# Altium schematic symbol library IC.SchLib: 555 symbols (part 1 of 15) (continued)
## AD5791BRU (continued)

## AD7610
designator U?
16-Bit, 250 kSPS, Unipolar/Bipolar  Programmable Input PulSAR® ADC; Manufacturer: Analog Devices; Manufacturer No: AD7610BSTZ; Sort: 510; Tech: SMDR; Package: LQFP48; Price: 0
footprint LQFP48 (LQFP, 48-Leads, Body 9,0x9,0mm (max), Pitch 0,50mm, IPC Medium Density)
part A pins: 4 BYTESWAP, 5 OB/~{2C}, 8 SER/~{PAR}, 9 D0, 10 D1, 11 D2/DIVSCLK0, 12 D3/DIVSCLK1, 13 D4/EXT/~{INT}, 14 D5/INVSYNC, 15 D6/INVSCLK, 16 D7/RDC/SDIN, 21 D8/SDOUT, 22 D9/SDCLK, 23 D10/SYNC, 24 D11/RDERR, 25 D12/HW/~{SW}, 26 D13/SCIN, 27 D14/SCCLK, 28 D15/~{SCCS}, 29 BUSY, 30 TEN, 31 ~{RD}, 32 ~{CS}, 33 RESET, 34 PD, 35 ~{CNVST}, 36 BIPOLAR, 37 REF, 38 REFGND, 39 IN-, 43 IN+, 45 TEMP, 46 REFBUFIN, 47 PDREF, 48 PDBUF
part B pins: 1 AGND (power), 2 AVDD (power), 3 AGND (power), 6 OGND (power), 7 OGND (power), 17 OGND (power), 18 OVDD (power), 19 DVDD (power), 20 DGND (power), 40 VCC (power), 41 VEE (power), 42 AGND (power), 44 AVDD (power)

## AD7655ASTZ
designator U?
ADC 16bit, 1MSPS 4ch SAR serial interface; Manufacturer: Analog Devices, Farnell; Manufacturer No: AD7655ASTZ, 9453059; Comment2: 5Vcc, 120mW 3Vcc interface -40..85degC; Sort: 510; Tech: SMDR; Package: LQFP48; Price: 20
footprint LQFP48 (LQFP, 48-Leads, Body 9,0x9,0mm (max), Pitch 0,50mm, IPC Medium Density)
pins: 1 AGND (power), 2 AVDD (power), 3 A0 (in), 4 BYTESWAP (in), 5 A/~{B} (in), 6 DGND (power), 7 IMPULSE (in), 8 SER/~{PAR} (in), 9 D0 (out), 10 D1 (out), 11 DIVSCLK0/D2 (io), 12 DIVSCLK1/D3 (io), 13 EXT/~{INT}/D4 (io), 14 INVSYNC/D5 (io), 15 INVSCLK/D6 (io), 16 RDC/SDIN/D7 (io), 17 OGND (power), 18 OVDD (power), 19 DVDD (power), 20 DGND (power), 21 SDOUT/D8 (io), 22 SCLK/D9 (io), 23 SYNC/D10 (io), 24 RDERROR/D11 (io), 25 D12 (out), 26 D13 (out), 27 D14 (out), 28 D15 (out), 29 BUSY (out), 30 ~{EOC} (out), 31 ~{RD} (in), 32 ~{CS} (in), 33 RESET (in), 34 PD (in), 35 ~{CNVST} (in), 36 DVDD (power), 37 REF (in), 38 REFGND (power), 39 INB1 (in), 40 INBN (in), 41 INB2 (in), 42 REFB (in), 43 REFA (in), 44 INA2 (in), 45 INAN (in), 46 INA1 (in), 47 AGND (power), 48 AGND (power)

## AD7764
designator U?
ADC 24bit, 312kSPS, 109dB Sigma-Delta with On-Chip Buffers and Serial Interface; Manufacturer: Analog Devices; Manufacturer No: AD7764BRUZ; Sort: 510; Tech: SMDR; Package: TSSOP28; Price: 0
footprint TSSOP28 (TSSOP, 28-Leads, Body 9,8x4,5mm (max), Pitch 0,65mm, IPC Medium Density)
pins: 1 VinA- (in), 2 VoutA+ (out), 3 VinA+ (in), 4 VoutA- (out), 5 Vin- (in), 6 Vin+ (in), 7 AVdd2 (power), 8 AGND3 (power), 9 OVERRANGE (out), 10 SCO (out), 11 ~{FSO} (out), 12 SDO (out), 13 SDI (in), 14 ~{FSI} (in), 15 ~{SYNC} (in), 16 ~{RESET}/~{PWRDWN}, 17 DVdd (power), 18 DEC_RATE, 19 MCLK (in), 20 AGND2 (power), 21 AVdd2 (power), 22 Rbias, 23 AGND1 (power), 24 AVdd1 (power), 25 AVdd4 (power), 26 REFGND (power), 27 Vref+ (power), 28 AVdd3 (power)

## AD7765
designator U?
ADC 24bit, 156kSPS, 112dB Sigma-Delta with On-Chip Buffers and Serial Interface; Manufacturer: Analog Devices; Manufacturer No: AD7765BRUZ; Sort: 510; Tech: SMDR; Package: TSSOP28; Price: 0
footprint TSSOP28 (TSSOP, 28-Leads, Body 9,8x4,5mm (max), Pitch 0,65mm, IPC Medium Density)
pins: 1 VinA- (in), 2 VoutA+ (out), 3 VinA+ (in), 4 VoutA- (out), 5 Vin- (in), 6 Vin+ (in), 7 AVdd2 (power), 8 AGND3 (power), 9 OVERRANGE (out), 10 SCO (out), 11 ~{FSO} (out), 12 SDO (out), 13 SDI (in), 14 ~{FSI} (in), 15 ~{SYNC} (in), 16 ~{RESET}/~{PWRDWN}, 17 DVdd (power), 18 DEC_RATE, 19 MCLK (in), 20 AGND2 (power), 21 AVdd2 (power), 22 Rbias, 23 AGND1 (power), 24 AVdd1 (power), 25 AVdd4 (power), 26 REFGND (power), 27 Vref+ (power), 28 AVdd3 (power)

## AD7767BRUZ
designator U?
24bit oversampled SAR ADC 128kSPS; Manufacturer: Analog Devices, Farnell; Manufacturer No: AD7767BRUZ, 1607232; Comment2: 2.5Vcc 1.8..3.6Vcc interface 128kSPS -40..105degC; Sort: 510; Tech: SMDR; Package: TSSOP16; Price: 20,2
signal-integrity model Model Name (Model Description)
footprint TSSOP16 (TSSOP16 5x4.4mm R0.65mm)
pins: 1 AVDD (power), 2 VREF+ (in), 3 REFGND (power), 4 VIN+ (in), 5 VIN- (in), 6 AGND (power), 7 ~{SYNC}/~{PD} (in), 8 DVDD (power), 9 VDRIVE (power), 10 SDO (out), 11 DGND (power), 12 ~{DRDY} (out), 13 SCLK (in), 14 MCLK (in), 15 SDI (in), 16 ~{CS} (in)
1 alternate drawing of the same symbol

## AD7783BRU
designator U?, comment AD7783
24-Bit Sigma Delta ADC with Excitation Current Sources; Manufacturer: Analog Devices; Manufacturer No: AD7783BRU; Comment2: 3 or 5Vcc; Sort: 510; Tech: SMDR; Package: TSSOP16; Price: 0
signal-integrity model Model Name (Model Description)
footprint TSSOP16 (TSSOP16 5x4.4mm R0.65mm)
pins: 1 XTAL1, 2 REFIN+, 3 REFIN-, 4 AIN+ (in), 5 AIN- (in), 6 IOUT1, 7 IOUT2, 8 IPIN (in), 9 RANGE (in), 10 SCLK (io), 11 ~{CS} (in), 12 DOUT/~{RDY} (out), 13 MODE (in), 14 GND (power), 15 VDD (power), 16 XTAL2
1 alternate drawing of the same symbol

## AD7787
designator U?, comment AD7787BRM
ADC 24bit sigma-delta 2ch; Manufacturer: Analog Devices; Comment2: 2.5-5.25V 120SPS; Sort: 510; Tech: SMDR; Manufacturer No: AD7787BRM; Package: MSOP10; Price: 0
footprint MSOP10-1 (MSOP 10pin 3x3mm R0.5mm)
pins: 1 SCLK (in), 2 ~{CS} (in), 3 AIN1+ (in), 4 AIN1- (in), 5 REFIN+ (in), 6 AIN2 (in), 7 GND (power), 8 Vdd (power), 9 DOUT (out), 10 DIN (in)

## AD7791
designator U?, comment AD7791BRM
ADC 24bit sigma-delta 1ch; Manufacturer: Analog Devices; Comment2: 2.5/5.25V 120SPS; Sort: 510; Tech: SMDR; Manufacturer No: AD7791BRM; Package: MSOP10; Price: 0
footprint SOIC8-1
pins: 1 SCLK (in), 2 ~{CS} (in), 3 AIN+ (in), 4 AIN- (in), 5 REFIN+ (in), 6 REFIN- (in), 7 GND (power), 8 Vdd (power), 9 DOUT (out), 10 DIN (in)

## AD7887
designator U?
ADC 12-Bit 2.7V to 5.25V Micropower, 2-Channel, 125 kSPS; Manufacturer: Analog Devices; Manufacturer No: AD7887BRZ; Comment2: 2.7/5.25V 125 kSPS 12Bit; Sort: 510; Tech: SMDR; Package: SOIC8; Price: 0
footprint SOIC8-1
pins: 1 ~{CS}, 2 Vdd, 3 GND, 4 AIN1/Vref, 5 AIN0, 6 DIN, 7 DOUT, 8 SCLK

## AD8021AR
designator U?
Operational amplifier, Precision, Low Noise; Manufacturer: Analog, Farnell; Manufacturer No: AD8021ARZ, 9426000; Comment2: 5..24Vcc, 1mV offset 0.5uVofs/degC; Sort: 520; Tech: SMDR; Package: SOIC8; Price: 5,4
footprint SOIC8-1
pins: 1 LREF, 2 -IN (in), 3 +IN (in), 4 -Vs (power), 5 COMP, 6 OUT (out), 7 +Vs (power), 8 DI~{S}

## AD8021ARM
designator U?
Operational amplifier, Precision, Low Noise Rail-to-Rail; Manufacturer: Analog, Farnell; Manufacturer No: AD8021ARMZ, 1651289; Comment2: 5..24Vcc, 1mV offset 0.5uVofs/degC; Sort: 520; Tech: SMDR; Package: MSOP8; Price: 5,4
footprint MSOP8-1 (TSOP, 8-Leads, Body 3,2x3,2mm (max), Pitch 0,65mm, IPC Medium Density)
pins: 1 LREF, 2 -IN (in), 3 +IN (in), 4 -Vs (power), 5 COMP, 6 OUT (out), 7 +Vs (power), 8 DI~{S}

## AD8099ARD
designator U?
Operational amplifier, Precision, Low Noise Rail-to-Rail; Manufacturer: National Semiconductors, Farnell; Manufacturer No: AD8099ARDZ, 8397848; Comment2: 5..12Vcc, 0.5mVoffset 0.5uVofs/degC 15mAcc; Sort: 520; Tech: SMDR; Package: SOIC8; Price: 3,7
footprint SOIC8-1
pins: 1 FB, 2 -IN (in), 3 +IN (in), 4 -Vs (power), 5 Cc, 6 OUT (out), 7 +Vs (power), 8 DI~{S}

## AD8307AR
designator U?, comment AD8307ARZ
500MHz 92dB Logarithmic Amplifier; Manufacturer: Analog Devices; Sort: 510; Tech: SMDR; Manufacturer No: AD8307ARZ; Package: SOIC8; Price: 0
footprint SOIC8-1
pins: 1 INM (in), 2 COM (power), 3 OFS, 4 OUT (out), 5 INT (in), 6 ENB (in), 7 VPS (power), 8 INP (in)

## AD8318
designator U?
1MHz to 8GHz, 70 dB Logarithmic Detector/Controller; Manufacturer: Analog Devices; Manufacturer No: AD8318ACPZ-WP; Sort: 510; Tech: SMDR; Package: LFCSP16; Price: 0
footprint QFN65P400X400X100-16N2 (QFN, 16-Leads, Body 4,0x4,0mm (max), Pitch 0,65mm, IPC Medium Density)
pins: 1 CMIP, 2 CMIP, 3 VPSI, 4 VPSI, 5 CLPF, 6 VOUT, 7 VSET, 8 CMOP, 9 VPSO, 10 TADJ, 11 CMIP, 12 CMIP, 13 TEMP, 14 INHI, 15 INLO, 16 ENBL, 17 EP (power)

## AD8341
designator U?
1.5 GHz to 2.4 GHz RF Vector Modulator; Manufacturer: Analog Devices; Manufacturer No: AD8341ACPZ-WP; Sort: 510; Tech: SMDR; Package: LFCSP24; Price: 0
footprint LFCSP24
pins: 1 QFLP, 2 QFLM, 3 QBBP, 4 QBBM, 5 VPS2 (power), 6 VPS2 (power), 7 CMOP, 8 CMOP, 9 RFOP, 10 RFOM, 11 CMOP, 12 CMOP, 13 DSOP, 14 VPS2 (power), 15 IBBM, 16 IBBP, 17 IFLM, 18 IFLP, 19 VPRF (power), 20 CMRF, 21 RFIM, 22 RFIP, 23 CMRF, 24 VPRF (power), 25 EPGND (power)

## AD8367A
designator U?
500MHz AGC; Manufacturer: Analog Devices; Manufacturer No: AD8367ARUZ; Sort: 510; Tech: SMDR; Package: TSSOP14; Price: 0
footprint TSSOP14 (TSSOP16 5x4.4mm R0.65mm)
pins: 1 ICOM (power), 2 ENBL (in), 3 INPT (in), 4 MODE (in), 5 GAIN (in), 6 DETO (out), 7 ICOM (power), 8 OCOM (power), 9 DECL (out), 10 VOUT (out), 11 VPSO (power), 12 VPSI (power), 13 HPFL, 14 ICOM (power)

## AD8368
designator U?
500MHz AGC; Manufacturer: Analog Devices; Manufacturer No: AD8367ARUZ; Sort: 510; Tech: SMDR; Package: TSSOP14; Price: 0
footprint LFCSP24
pins: 1 GAIN (in), 2 DETO (out), 3 HPFL, 4 DECL (out), 5 DETI (in), 6 OCOM (power), 7 OCOM (power), 8 OUTP (out), 9 VPSO (power), 10 VPSO (power), 11 VPSI (power), 12 VPSI (power), 13 VPSI (power), 14 DECL (out), 15 DECL (out), 16 ICOM (power), 17 ICOM (power), 18 ICOM (power), 19 INPT (in), 20 ICOM (power), 21 MODE (in), 22 VPSI (power), 23 VPSI (power), 24 ENBL (in), 25 EPAD

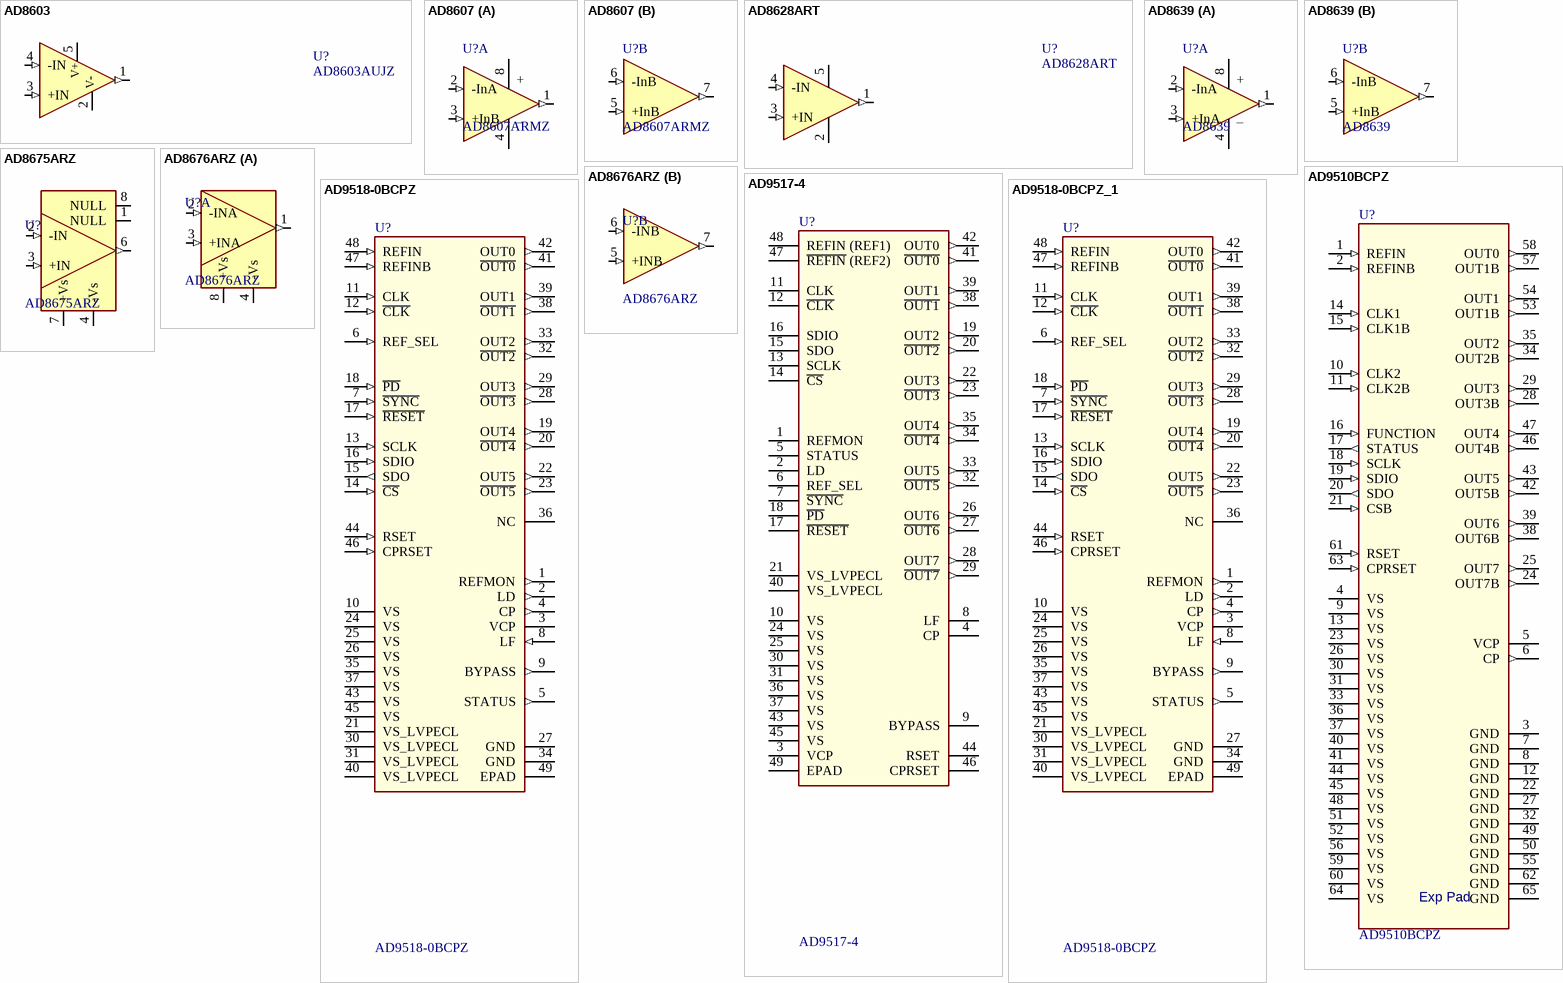
[diagram p3: symbols AD8603 to AD9518-0BCPZ_1]

## AD8603
designator U?, comment AD8603AUJZ
Low noise, Single-Supply, Rail-to-rail IO, Operational Amplifier; Manufacturer: Analog Devices, Farnell; Manufacturer No: AD8603AUJZ, 1651290; Comment2: 1.8-5Vcc, 400KHzBW; Sort: 510; Tech: SMDR; Package: SOT23-5; Price: 0
footprint SOT23-5
pins: 1 OUT (out), 2 V- (power), 3 +IN (in), 4 -IN (in), 5 V+ (power)

## AD8607
designator U?, comment AD8607ARMZ
Operational amplifier, Precision, Low Noise Rail-to-Rail; Manufacturer: National Semiconductors; Comment2: 1.8..5V, 50uV offset; Sort: 510; Tech: SMDR; Manufacturer No: AD8607ARMZ; Package: TSSOP8; Price: 0
footprint TSSOP8 (TSSOP8 3x3mm R0.65mm)
part A pins: 1 OUT (out), 2 -InA (in), 3 +InB (in), 4 V- (power), 8 V+ (power)
part B pins: 5 +InB (in), 6 -InB (in), 7 OUT (out)
part A text: +; _

## AD8628ART
designator U?
Zero-Drift, Single-Supply, Rail-to-rail, Input/Output Operational Amplifier; Manufacturer: Analog Devices; Manufacturer No: AD8628ART-R2; Sort: 510; Tech: SMDR; Package: SOT23; Price: 0
footprint SOT23-5
pins: 1 OUT (out), 2 V- (power), 3 +IN (in), 4 -IN (in), 5 V+ (power)

## AD8639
designator U?
16V Auto-Zero Rail-to-Rail Output Operational Amplifier; Manufacturer: Analog Devices; Manufacturer No: AD8639ARMZ; Comment2: 5V..16V single, +-2.5..+-8V, 9uV offset, 40pA bias input current; Sort: 510; Tech: SMDR; Package: MSOP-8; Price: 0
footprint MSOP8-1 (TSOP, 8-Leads, Body 3,2x3,2mm (max), Pitch 0,65mm, IPC Medium Density)
part A pins: 1 OutA (out), 2 -InA (in), 3 +InA (in), 4 V- (power), 8 V+ (power)
part B pins: 5 +InB (in), 6 -InB (in), 7 OutB (out)
part A text: +; _

## AD8675ARZ
designator U?
Operational amplifier, Precision, Low Noise; Manufacturer: Analog, Farnell; Manufacturer No: AD8675ARZ, 1389164; Comment2: +-5..+-18Vcc, 75uVofs 0.6uV/degC; Sort: 520; Tech: SMDR; Package: SOIC8; Price: 4.1
footprint SOIC8-1
pins: 1 NULL, 2 -IN (in), 3 +IN (in), 4 -Vs (power), 6 OUT (out), 7 +Vs (power), 8 NULL

## AD8676ARZ
designator U?
Dual Operational amplifier, Precision, Low Noise; Manufacturer: Analog, Farnell; Manufacturer No: AD8676ARZ, 1316453; Comment2: +-5..+-18Vcc, 12uVofs 0.6uV/degC; Sort: 520; Tech: SMDR; Package: SOIC8; Price: 4.3
footprint SOIC8-1
part A pins: 1 OUTA (out), 2 -INA (in), 3 +INA (in), 4 -Vs (power), 8 +Vs (power)
part B pins: 5 +INB (in), 6 -INB (in), 7 OUTB (out)

## AD9510BCPZ
designator U?
1.2 GHz Clock Distribution, LFCSP64; Manufacturer: Analog Devices; Sort: 510; Tech: SMDR; Manufacturer No: AD9510BCPZ; Package: LFCSP64; Price: 0
footprint LFCSP64-1
pins: 1 REFIN (in), 2 REFINB (in), 3 GND (power), 4 VS (power), 5 VCP (power), 6 CP (out), 7 GND (power), 8 GND (power), 9 VS (power), 10 CLK2 (in), 11 CLK2B (in), 12 GND (power), 13 VS (power), 14 CLK1 (in), 15 CLK1B (in), 16 FUNCTION (in), 17 STATUS (out), 18 SCLK (in), 19 SDIO (in), 20 SDO (out), 21 CSB (in), 22 GND (power), 23 VS (power), 24 OUT7B (out), 25 OUT7 (out), 26 VS (power), 27 GND (power), 28 OUT3B (out), 29 OUT3 (out), 30 VS (power), 31 VS (power), 32 GND (power), 33 VS (power), 34 OUT2B (out), 35 OUT2 (out), 36 VS (power), 37 VS (power), 38 OUT6B (out), 39 OUT6 (out), 40 VS (power), 41 VS (power), 42 OUT5B (out), 43 OUT5 (out), 44 VS (power), 45 VS (power), 46 OUT4B (out), 47 OUT4 (out), 48 VS (power), 49 GND (power), 50 GND (power), 51 VS (power), 52 VS (power), 53 OUT1B (out), 54 OUT1 (out), 55 GND (power), 56 VS (power), 57 OUT1B (out), 58 OUT0 (out), 59 VS (power), 60 VS (power), 61 RSET (in), 62 GND (power), 63 CPRSET (in), 64 VS (power), 65 GND (power)
text: Exp Pad

## AD9517-4
designator U?
12-Output clock generator with integrated 1.6 GHz VCO; Manufacturer No: AD9517-4BCPZ; Manufacturer: Analog Devices; Sort: 510; Tech: SMDR; Package: LFCSP48; Price: 0
footprint LFCSP48
pins: 1 REFMON, 2 LD, 3 VCP, 4 CP, 5 STATUS, 6 REF_SEL, 7 ~{SYNC}, 8 LF, 9 BYPASS, 10 VS (power), 11 CLK, 12 ~{CLK}, 13 SCLK, 14 ~{CS}, 15 SDO, 16 SDIO, 17 ~{RESET}, 18 ~{PD}, 19 OUT2 (out), 20 ~{OUT2} (out), 21 VS_LVPECL (power), 22 OUT3 (out), 23 ~{OUT3} (out), 24 VS (power), 25 VS (power), 26 OUT6 (out), 27 ~{OUT6} (out), 28 OUT7 (out), 29 ~{OUT7} (out), 30 VS (power), 31 VS (power), 32 ~{OUT5} (out), 33 OUT5 (out), 34 ~{OUT4} (out), 35 OUT4 (out), 36 VS (power), 37 VS (power), 38 ~{OUT1} (out), 39 OUT1 (out), 40 VS_LVPECL (power), 41 ~{OUT0} (out), 42 OUT0 (out), 43 VS (power), 44 RSET, 45 VS (power), 46 CPRSET, 47 ~{REFIN} (REF2), 48 REFIN (REF1), 49 EPAD (power)

## AD9518-0BCPZ
designator U?
6-Output CLK Gen with 2.8 GHz VCO, LFCSP48; Manufacturer: Analog Devices; Sort: 510; Tech: SMDR; Manufacturer No: AD9518-0BCPZ; Package: LFCSP48; Price: 0
footprint LFCSP48
pins: 1 REFMON (out), 2 LD (out), 3 VCP (power), 4 CP (out), 5 STATUS (out), 6 REF_SEL (in), 7 ~{SYNC} (in), 8 LF (in), 9 BYPASS (out), 10 VS (power), 11 CLK (in), 12 ~{CLK} (in), 13 SCLK (in), 14 ~{CS} (in), 15 SDO (out), 16 SDIO (in), 17 ~{RESET} (in), 18 ~{PD} (in), 19 OUT4 (out), 20 ~{OUT4} (out), 21 VS_LVPECL (power), 22 OUT5 (out), 23 ~{OUT5} (out), 24 VS (power), 25 VS (power), 26 VS (power), 27 GND (power), 28 ~{OUT3} (out), 29 OUT3 (out), 30 VS_LVPECL (power), 31 VS_LVPECL (power), 32 ~{OUT2} (out), 33 OUT2 (out), 34 GND (power), 35 VS (power), 36 NC, 37 VS (power), 38 ~{OUT1} (out), 39 OUT1 (out), 40 VS_LVPECL (power), 41 ~{OUT0} (out), 42 OUT0 (out), 43 VS (power), 44 RSET (in), 45 VS (power), 46 CPRSET (in), 47 REFINB (in), 48 REFIN (in), 49 EPAD (power)

## AD9518-0BCPZ_1
designator U?, comment AD9518-0BCPZ
6-Output CLK Gen with 2.8 GHz VCO, LFCSP48; Manufacturer: Analog Devices; Sort: 510; Tech: SMDR; Manufacturer No: AD9518-0BCPZ; Package: LFCSP48; Price: 0
footprint LFCSP48a
pins: 1 REFMON (out), 2 LD (out), 3 VCP (power), 4 CP (out), 5 STATUS (out), 6 REF_SEL (in), 7 ~{SYNC} (in), 8 LF (in), 9 BYPASS (out), 10 VS (power), 11 CLK (in), 12 ~{CLK} (in), 13 SCLK (in), 14 ~{CS} (in), 15 SDO (out), 16 SDIO (in), 17 ~{RESET} (in), 18 ~{PD} (in), 19 OUT4 (out), 20 ~{OUT4} (out), 21 VS_LVPECL (power), 22 OUT5 (out), 23 ~{OUT5} (out), 24 VS (power), 25 VS (power), 26 VS (power), 27 GND (power), 28 ~{OUT3} (out), 29 OUT3 (out), 30 VS_LVPECL (power), 31 VS_LVPECL (power), 32 ~{OUT2} (out), 33 OUT2 (out), 34 GND (power), 35 VS (power), 36 NC, 37 VS (power), 38 ~{OUT1} (out), 39 OUT1 (out), 40 VS_LVPECL (power), 41 ~{OUT0} (out), 42 OUT0 (out), 43 VS (power), 44 RSET (in), 45 VS (power), 46 CPRSET (in), 47 REFINB (in), 48 REFIN (in), 49 EPAD (power)

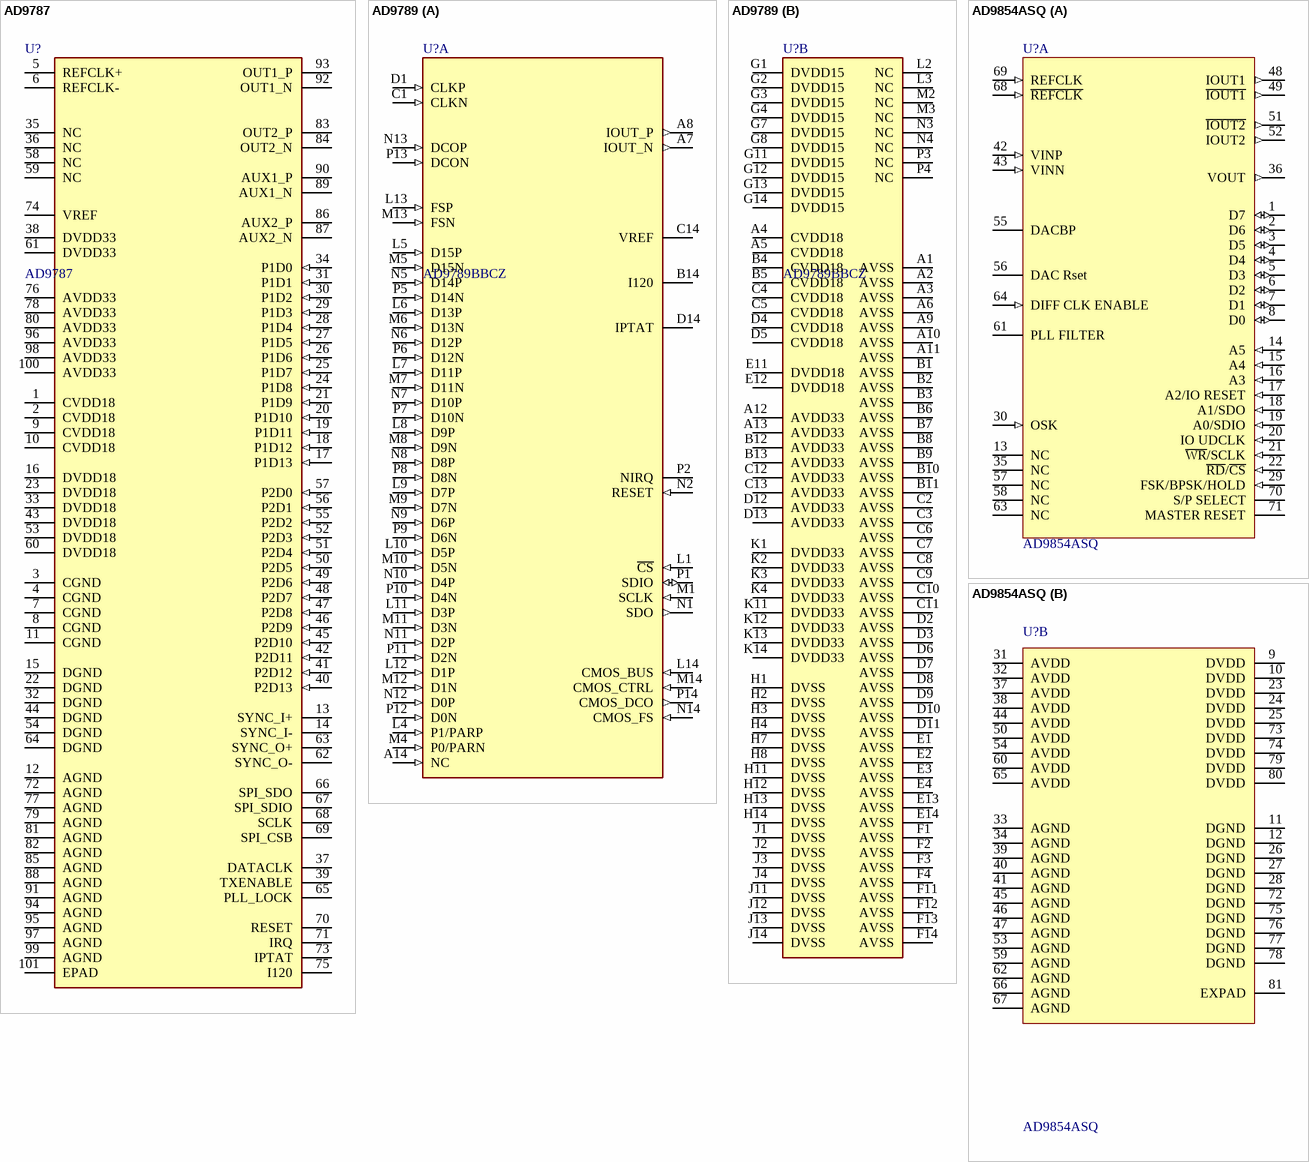
[diagram p4: symbols AD9787 to AD9854ASQ]

## AD9787
designator U?
Dual 14bit 800 MSPS DAC with Low Power 32-bit Complex NCO; Manufacturer No: AD9787BSVZ; Manufacturer: Analog Devices; Tech: SMDR; Sort: 510; Package: TQFP100
footprint TQFP100_EP (Thin QFP 100, 14x14mm, R0.5mm, IPC Medium Density)
pins: 1 CVDD18 (power), 2 CVDD18 (power), 3 CGND, 4 CGND, 5 REFCLK+, 6 REFCLK-, 7 CGND, 8 CGND, 9 CVDD18 (power), 10 CVDD18 (power), 11 CGND, 12 AGND (power), 13 SYNC_I+, 14 SYNC_I-, 15 DGND, 16 DVDD18 (power), 17 P1D13 (in), 18 P1D12 (in), 19 P1D11 (in), 20 P1D10 (in), 21 P1D9 (in), 22 DGND, 23 DVDD18 (power), 24 P1D8 (in), 25 P1D7 (in), 26 P1D6 (in), 27 P1D5 (in), 28 P1D4 (in), 29 P1D3 (in), 30 P1D2 (in), 31 P1D1 (in), 32 DGND, 33 DVDD18 (power), 34 P1D0 (in), 35 NC, 36 NC, 37 DATACLK, 38 DVDD33 (power), 39 TXENABLE, 40 P2D13 (in), 41 P2D12 (in), 42 P2D11 (in), 43 DVDD18 (power), 44 DGND, 45 P2D10 (in), 46 P2D9 (in), 47 P2D8 (in), 48 P2D7 (in), 49 P2D6 (in), 50 P2D5 (in), 51 P2D4 (in), 52 P2D3 (in), 53 DVDD18 (power), 54 DGND, 55 P2D2 (in), 56 P2D1 (in), 57 P2D0 (in), 58 NC, 59 NC, 60 DVDD18 (power), 61 DVDD33 (power), 62 SYNC_O-, 63 SYNC_O+, 64 DGND, 65 PLL_LOCK, 66 SPI_SDO, 67 SPI_SDIO, 68 SCLK, 69 SPI_CSB, 70 RESET, 71 IRQ, 72 AGND (power), 73 IPTAT, 74 VREF, 75 I120, 76 AVDD33 (power), 77 AGND (power), 78 AVDD33 (power), 79 AGND (power), 80 AVDD33 (power), 81 AGND (power), 82 AGND (power), 83 OUT2_P, 84 OUT2_N, 85 AGND (power), 86 AUX2_P, 87 AUX2_N, 88 AGND (power), 89 AUX1_N, 90 AUX1_P, 91 AGND (power), 92 OUT1_N, 93 OUT1_P, 94 AGND (power), 95 AGND (power), 96 AVDD33 (power), 97 AGND (power), 98 AVDD33 (power), 99 AGND (power), 100 AVDD33 (power), 101 EPAD (power)

## AD9789
designator U?, comment AD9789BBCZ
14-Bit, 2400 MSPS RF DAC  with 4-Channel Signal Processing; Manufacturer: Analog Devices; Tech: SMDR; Sort: 510; Manufacturer No: AD9789BBCZ; Package: BGA164
footprint BGA164C80P14X14_1200X1200X130 (BGA, 164-Leads, Body 12,0x12,0mm,  Pitch 0,80mm)
part A pins: A7 IOUT_N (out), A8 IOUT_P (out), A14 NC (in), B14 I120, C1 CLKN (in), C14 VREF, D1 CLKP (in), D14 IPTAT, L1 ~{CS} (in), L4 P1/PARP (in), L5 D15P (in), L6 D13P (in), L7 D11P (in), L8 D9P (in), L9 D7P (in), L10 D5P (in), L11 D3P (in), L12 D1P (in), L13 FSP (in), L14 CMOS_BUS (in), M1 SCLK (in), M4 P0/PARN (in), M5 D15N (in), M6 D13N (in), M7 D11N (in), M8 D9N (in), M9 D7N (in), M10 D5N (in), M11 D3N (in), M12 D1N (in), M13 FSN (in), M14 CMOS_CTRL (in), N1 SDO (out), N2 RESET (in), N5 D14P (in), N6 D12P (in), N7 D10P (in), N8 D8P (in), N9 D6P (in), N10 D4P (in), N11 D2P (in), N12 D0P (in), N13 DCOP (in), N14 CMOS_FS (in), P1 SDIO (io), P2 NIRQ (oc), P5 D14N (in), P6 D12N (in), P7 D10N (in), P8 D8N (in), P9 D6N (in), P10 D4N (in), P11 D2N (in), P12 D0N (in), P13 DCON (in), P14 CMOS_DCO (out)
part B pins: A1 AVSS (power), A2 AVSS (power), A3 AVSS (power), A4 CVDD18 (power), A5 CVDD18 (power), A6 AVSS (power), A9 AVSS (power), A10 AVSS (power), A11 AVSS (power), A12 AVDD33 (power), A13 AVDD33 (power), B1 AVSS (power), B2 AVSS (power), B3 AVSS (power), B4 CVDD18 (power), B5 CVDD18 (power), B6 AVSS (power), B7 AVSS (power), B8 AVSS (power), B9 AVSS (power), B10 AVSS (power), B11 AVSS (power), B12 AVDD33 (power), B13 AVDD33 (power), C2 AVSS (power), C3 AVSS (power), C4 CVDD18 (power), C5 CVDD18 (power), C6 AVSS (power), C7 AVSS (power), C8 AVSS (power), C9 AVSS (power), C10 AVSS (power), C11 AVSS (power), C12 AVDD33 (power), C13 AVDD33 (power), D2 AVSS (power), D3 AVSS (power), D4 CVDD18 (power), D5 CVDD18 (power), D6 AVSS (power), D7 AVSS (power), D8 AVSS (power), D9 AVSS (power), D10 AVSS (power), D11 AVSS (power), D12 AVDD33 (power), D13 AVDD33 (power), E1 AVSS (power), E2 AVSS (power), E3 AVSS (power), E4 AVSS (power), E11 DVDD18 (power), E12 DVDD18 (power), E13 AVSS (power), E14 AVSS (power), F1 AVSS (power), F2 AVSS (power), F3 AVSS (power), F4 AVSS (power), F11 AVSS (power), F12 AVSS (power), F13 AVSS (power), F14 AVSS (power), G1 DVDD15 (power), G2 DVDD15 (power), G3 DVDD15 (power), G4 DVDD15 (power), G7 DVDD15 (power), G8 DVDD15 (power), G11 DVDD15 (power), G12 DVDD15 (power), G13 DVDD15 (power), G14 DVDD15 (power), H1 DVSS (power), H2 DVSS (power), H3 DVSS (power), H4 DVSS (power), H7 DVSS (power), H8 DVSS (power), H11 DVSS (power), H12 DVSS (power), H13 DVSS (power), H14 DVSS (power), J1 DVSS (power), J2 DVSS (power), J3 DVSS (power), J4 DVSS (power), J11 DVSS (power), J12 DVSS (power), J13 DVSS (power), J14 DVSS (power), K1 DVDD33 (power), K2 DVDD33 (power), K3 DVDD33 (power), K4 DVDD33 (power), K11 DVDD33 (power), K12 DVDD33 (power), K13 DVDD33 (power), K14 DVDD33 (power), L2 NC, L3 NC, M2 NC, M3 NC, N3 NC, N4 NC, P3 NC, P4 NC

## AD9854ASQ
designator U?
CMOS 300 MSPS Quadrature Complete DDS; Sort: 510; Tech: SMDR; Package: PQFP-80; Price: 0
footprint QFP80_M (QFP, 80-Leads, Body 14 x 14mm, Pitch 0.65mm, IPC Low Density)
part A pins: 1 D7 (io), 2 D6 (io), 3 D5 (io), 4 D4 (io), 5 D3 (io), 6 D2 (io), 7 D1 (io), 8 D0 (io), 13 NC, 14 A5 (in), 15 A4 (in), 16 A3 (in), 17 A2/IO RESET (in), 18 A1/SDO (in), 19 A0/SDIO (in), 20 IO UDCLK (in), 21 ~{WR}/SCLK (in), 22 ~{RD}/~{CS} (in), 29 FSK/BPSK/HOLD (in), 30 OSK (in), 35 NC, 36 VOUT (out), 42 VINP (in), 43 VINN (in), 48 IOUT1 (out), 49 ~{IOUT1} (out), 51 ~{IOUT2} (out), 52 IOUT2 (out), 55 DACBP, 56 DAC Rset, 57 NC, 58 NC, 61 PLL FILTER, 63 NC, 64 DIFF CLK ENABLE (in), 68 ~{REFCLK} (in), 69 REFCLK (in), 70 S/P SELECT, 71 MASTER RESET
part B pins: 9 DVDD (power), 10 DVDD (power), 11 DGND (power), 12 DGND (power), 23 DVDD (power), 24 DVDD (power), 25 DVDD (power), 26 DGND (power), 27 DGND (power), 28 DGND (power), 31 AVDD, 32 AVDD, 33 AGND (power), 34 AGND (power), 37 AVDD, 38 AVDD, 39 AGND (power), 40 AGND (power), 41 AGND (power), 44 AVDD, 45 AGND (power), 46 AGND (power), 47 AGND (power), 50 AVDD, 53 AGND (power), 54 AVDD, 59 AGND (power), 60 AVDD, 62 AGND (power), 65 AVDD, 66 AGND (power), 67 AGND (power), 72 DGND (power), 73 DVDD (power), 74 DVDD (power), 75 DGND (power), 76 DGND (power), 77 DGND (power), 78 DGND (power), 79 DVDD (power), 80 DVDD (power), 81 EXPAD (power)

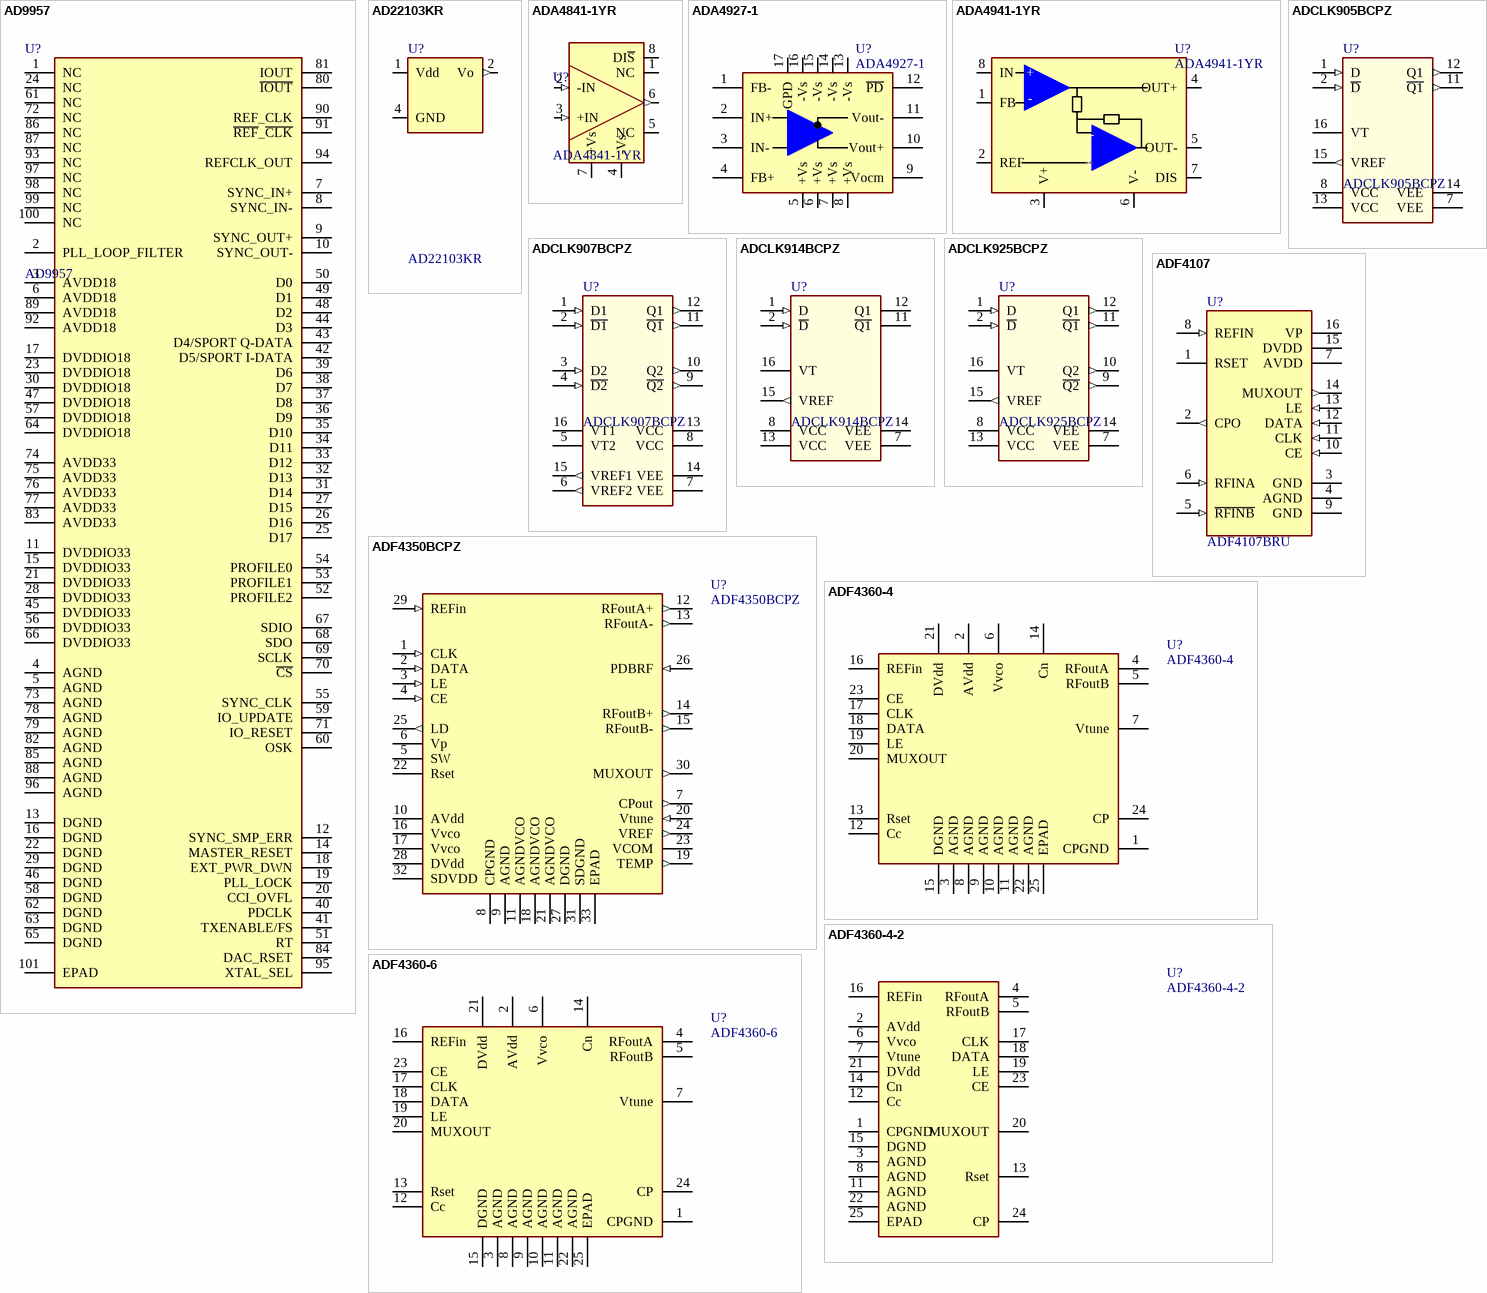
[diagram p5: symbols AD9957 to ADF4360-6]

## AD9957
designator U?
1 GSPS Quadrature Digital Upconverter with 18-bit I/Q Data Path and 14-bit DAC; Manufacturer No: AD9957BSVZ; Manufacturer: Analog Devices; Tech: SMDR; Sort: 510; Package: TQFP100
footprint TQFP100_EP (Thin QFP 100, 14x14mm, R0.5mm, IPC Medium Density)
pins: 1 NC, 2 PLL_LOOP_FILTER, 3 AVDD18 (power), 4 AGND (power), 5 AGND (power), 6 AVDD18 (power), 7 SYNC_IN+, 8 SYNC_IN-, 9 SYNC_OUT+, 10 SYNC_OUT-, 11 DVDDIO33 (power), 12 SYNC_SMP_ERR, 13 DGND (power), 14 MASTER_RESET, 15 DVDDIO33 (power), 16 DGND (power), 17 DVDDIO18 (power), 18 EXT_PWR_DWN, 19 PLL_LOCK, 20 CCI_OVFL, 21 DVDDIO33 (power), 22 DGND (power), 23 DVDDIO18 (power), 24 NC, 25 D17, 26 D16, 27 D15, 28 DVDDIO33 (power), 29 DGND (power), 30 DVDDIO18 (power), 31 D14, 32 D13, 33 D12, 34 D11, 35 D10, 36 D9, 37 D8, 38 D7, 39 D6, 40 PDCLK, 41 TXENABLE/FS, 42 D5/SPORT I-DATA, 43 D4/SPORT Q-DATA, 44 D3, 45 DVDDIO33 (power), 46 DGND (power), 47 DVDDIO18 (power), 48 D2, 49 D1, 50 D0, 51 RT, 52 PROFILE2, 53 PROFILE1, 54 PROFILE0, 55 SYNC_CLK, 56 DVDDIO33 (power), 57 DVDDIO18 (power), 58 DGND (power), 59 IO_UPDATE, 60 OSK, 61 NC, 62 DGND (power), 63 DGND (power), 64 DVDDIO18 (power), 65 DGND (power), 66 DVDDIO33 (power), 67 SDIO, 68 SDO, 69 SCLK, 70 ~{CS}, 71 IO_RESET, 72 NC, 73 AGND (power), 74 AVDD33 (power), 75 AVDD33 (power), 76 AVDD33 (power), 77 AVDD33 (power), 78 AGND (power), 79 AGND (power), 80 ~{IOUT}, 81 IOUT, 82 AGND (power), 83 AVDD33 (power), 84 DAC_RSET, 85 AGND (power), 86 NC, 87 NC, 88 AGND (power), 89 AVDD18 (power), 90 REF_CLK, 91 ~{REF}_~{CLK}, 92 AVDD18 (power), 93 NC, 94 REFCLK_OUT, 95 XTAL_SEL, 96 AGND (power), 97 NC, 98 NC, 99 NC, 100 NC, 101 EPAD

## AD22103KR
designator U?
Voltage out temperature sensor 28mV/degC; Manufacturer: Analog Devices, Farnell; Manufacturer No: AD22103KRZ, 1438949; Comment2: 2.7-3.6Vcc, 0..+100degC, +-0.5degC; Sort: 510; Tech: SMDR; Package: SOIC8; Price: 3.63
footprint SOIC8-1
pins: 1 Vdd (power), 2 Vo (out), 4 GND (power)

## ADA4841-1YR
designator U?
Operational amplifier, Precision, Low Noise; Manufacturer: Analog, Farnell; Manufacturer No: ADA4841-1YRZ, 1838875; Comment2: 2.7..12Vcc, 0.3mVoffset 1uVofs/degC 1.5mAcc; Sort: 520; Tech: SMDR; Package: SOIC8; Price: 3,6
footprint SOIC8-1
pins: 1 NC, 2 -IN (in), 3 +IN (in), 4 -Vs (power), 5 NC, 6 OUT (out), 7 +Vs (power), 8 DI~{S}

## ADA4927-1
designator U?
Ultralow Distortion Current Feedback Differential ADC Driver; Manufacturer: Analog Devices; Manufacturer No: ADA4927-1YCPZ-R2; Sort: 510; Tech: THDW; Package: CP-16-2; Price: 0
footprint LFCSP16 (Lead Frame Chip Scale Package 16 pin 3x3mm R0.5mm)
pins: 1 FB-, 2 IN+, 3 IN-, 4 FB+, 5 +Vs, 6 +Vs, 7 +Vs, 8 +Vs, 9 Vocm, 10 Vout+, 11 Vout-, 12 ~{PD}, 13 -Vs, 14 -Vs, 15 -Vs, 16 -Vs, 17 GPD

## ADA4941-1YR
designator U?
Single-Supply, Differential  18-Bit ADC Driver; Manufacturer: Analog Devices; Manufacturer No: ADA4941-1YRZ; Comment2: 2.7..12Vcc 0.8mVoffset 2.2mAcc; Sort: 520; Tech: SMDR; Package: SOIC8; Price: 0
footprint SOIC8-1
pins: 1 FB, 2 REF, 3 V+, 4 OUT+, 5 OUT-, 6 V-, 7 DIS, 8 IN
text: +; -

## ADCLK905BCPZ
designator U?
2.5V / 3.3V ECL 1:2  Ultarfast Differential Buffer; Manufacturer: Analog Devices; Comment2: 60fs max jitter; Sort: 510; Tech: SMDR; Manufacturer No: ADCLK905BCPZ; Package: LFCSP16; Price: 0
footprint LFCSP16 (Lead Frame Chip Scale Package 16 pin 3x3mm R0.5mm)
signal-integrity model Model Name (Model Description)
pins: 1 D (in), 2 ~{D} (in), 7 VEE (power), 8 VCC (power), 11 ~{Q1} (out), 12 Q1 (out), 13 VCC (power), 14 VEE (power), 15 VREF (out), 16 VT

## ADCLK907BCPZ
designator U?
2.5V / 3.3V ECL 1:2  Ultarfast Differential Dual Buffer; Manufacturer: Analog Devices; Comment2: 60fs max jitter; Sort: 510; Tech: SMDR; Manufacturer No: ADCLK907BCPZ; Package: LFCSP16; Price: 0
footprint LFCSP16 (Lead Frame Chip Scale Package 16 pin 3x3mm R0.5mm)
signal-integrity model Model Name (Model Description)
pins: 1 D1 (in), 2 ~{D1} (in), 3 D2 (in), 4 ~{D2} (in), 5 VT2, 6 VREF2 (out), 7 VEE (power), 8 VCC (power), 9 ~{Q2} (out), 10 Q2 (out), 11 ~{Q1} (out), 12 Q1 (out), 13 VCC (power), 14 VEE (power), 15 VREF1 (out), 16 VT1

## ADCLK914BCPZ
designator U?
Ultrafast, SiGe, Open-Collector  HVDS Clock/Data Buffer; Manufacturer: Analog Devices; Comment2: 3.3V;; Sort: 510; Tech: SMDR; Manufacturer No: ADCLK914BCPZ; Package: LFCSP16; Price: 0
footprint LFCSP16 (Lead Frame Chip Scale Package 16 pin 3x3mm R0.5mm)
signal-integrity model Model Name (Model Description)
pins: 1 D (in), 2 ~{D} (in), 7 VEE (power), 8 VCC (power), 11 ~{Q1} (oc), 12 Q1 (oc), 13 VCC (power), 14 VEE (power), 15 VREF (out), 16 VT

## ADCLK925BCPZ
designator U?
2.5V / 3.3V ECL 1:2  Ultarfast Differential Fanout Buffer; Manufacturer: Analog Devices; Comment2: 60fs max jitter; Sort: 510; Tech: SMDR; Manufacturer No: ADCLK925BCPZ; Package: LFCSP16; Price: 0
footprint LFCSP16 (Lead Frame Chip Scale Package 16 pin 3x3mm R0.5mm)
signal-integrity model Model Name (Model Description)
pins: 1 D (in), 2 ~{D} (in), 7 VEE (power), 8 VCC (power), 9 ~{Q2} (out), 10 Q2 (out), 11 ~{Q1} (out), 12 Q1 (out), 13 VCC (power), 14 VEE (power), 15 VREF (out), 16 VT

## ADF4107
designator U?, comment ADF4107BRU
Low power RF frequency synthesizer 550MHz; Manufacturer: Analog Devices; Sort: 510; Tech: SMDR; Manufacturer No: ADF4107BRU; Package: TSSOP16; Price: 0; Comment_1: ADF4107BRU
footprint TSSOP16 (TSSOP16 5x4.4mm R0.65mm)
pins: 1 RSET, 2 CPO (out), 3 GND (power), 4 AGND (power), 5 ~{RFINB} (in), 6 RFINA (in), 7 AVDD (power), 8 REFIN (in), 9 GND (power), 10 CE (in), 11 CLK (in), 12 DATA (in), 13 LE (in), 14 MUXOUT (out), 15 DVDD (power), 16 VP (power)

## ADF4350BCPZ
designator U?
Wideband Synthesizer with Integrated VCO; Manufacturer: Analog Devices; Comment2: 3.3Vcc; 135 - 4400MHz; Sort: 510; Tech: SMDR; Manufacturer No: ADF4350BCPZ; Package: LFCSP32; Price: 0
footprint LFCSP32_EP (QFN, 32-Leads, Body 5,0x5,0mm (max), Pitch 0,50mm, IPC Medium Density)
pins: 1 CLK (in), 2 DATA (in), 3 LE (in), 4 CE (in), 5 SW (hiz), 6 Vp (power), 7 CPout (out), 8 CPGND (power), 9 AGND, 10 AVdd (power), 11 AGNDVCO (power), 12 RFoutA+ (out), 13 RFoutA- (out), 14 RFoutB+ (out), 15 RFoutB- (out), 16 Vvco (power), 17 Vvco (power), 18 AGNDVCO (power), 19 TEMP (out), 20 Vtune (in), 21 AGNDVCO (power), 22 Rset, 23 VCOM, 24 VREF (out), 25 LD (out), 26 PDBRF (in), 27 DGND (power), 28 DVdd (power), 29 REFin (in), 30 MUXOUT (out), 31 SDGND (power), 32 SDVDD (power), 33 EPAD